# Altium footprint library PowerSupply.PcbLib: 67 footprints (part 2 of 5)
Each footprint in its own frame and in the unit in brackets; x right, y up, seen from the top. Pads: shape width x height; smd on the part's side, far side on the other; paste and mask are expansions set on the pad; w line width, h text height; cw(c..) or ccw(c..) is an arc to the next point about the centre after c.
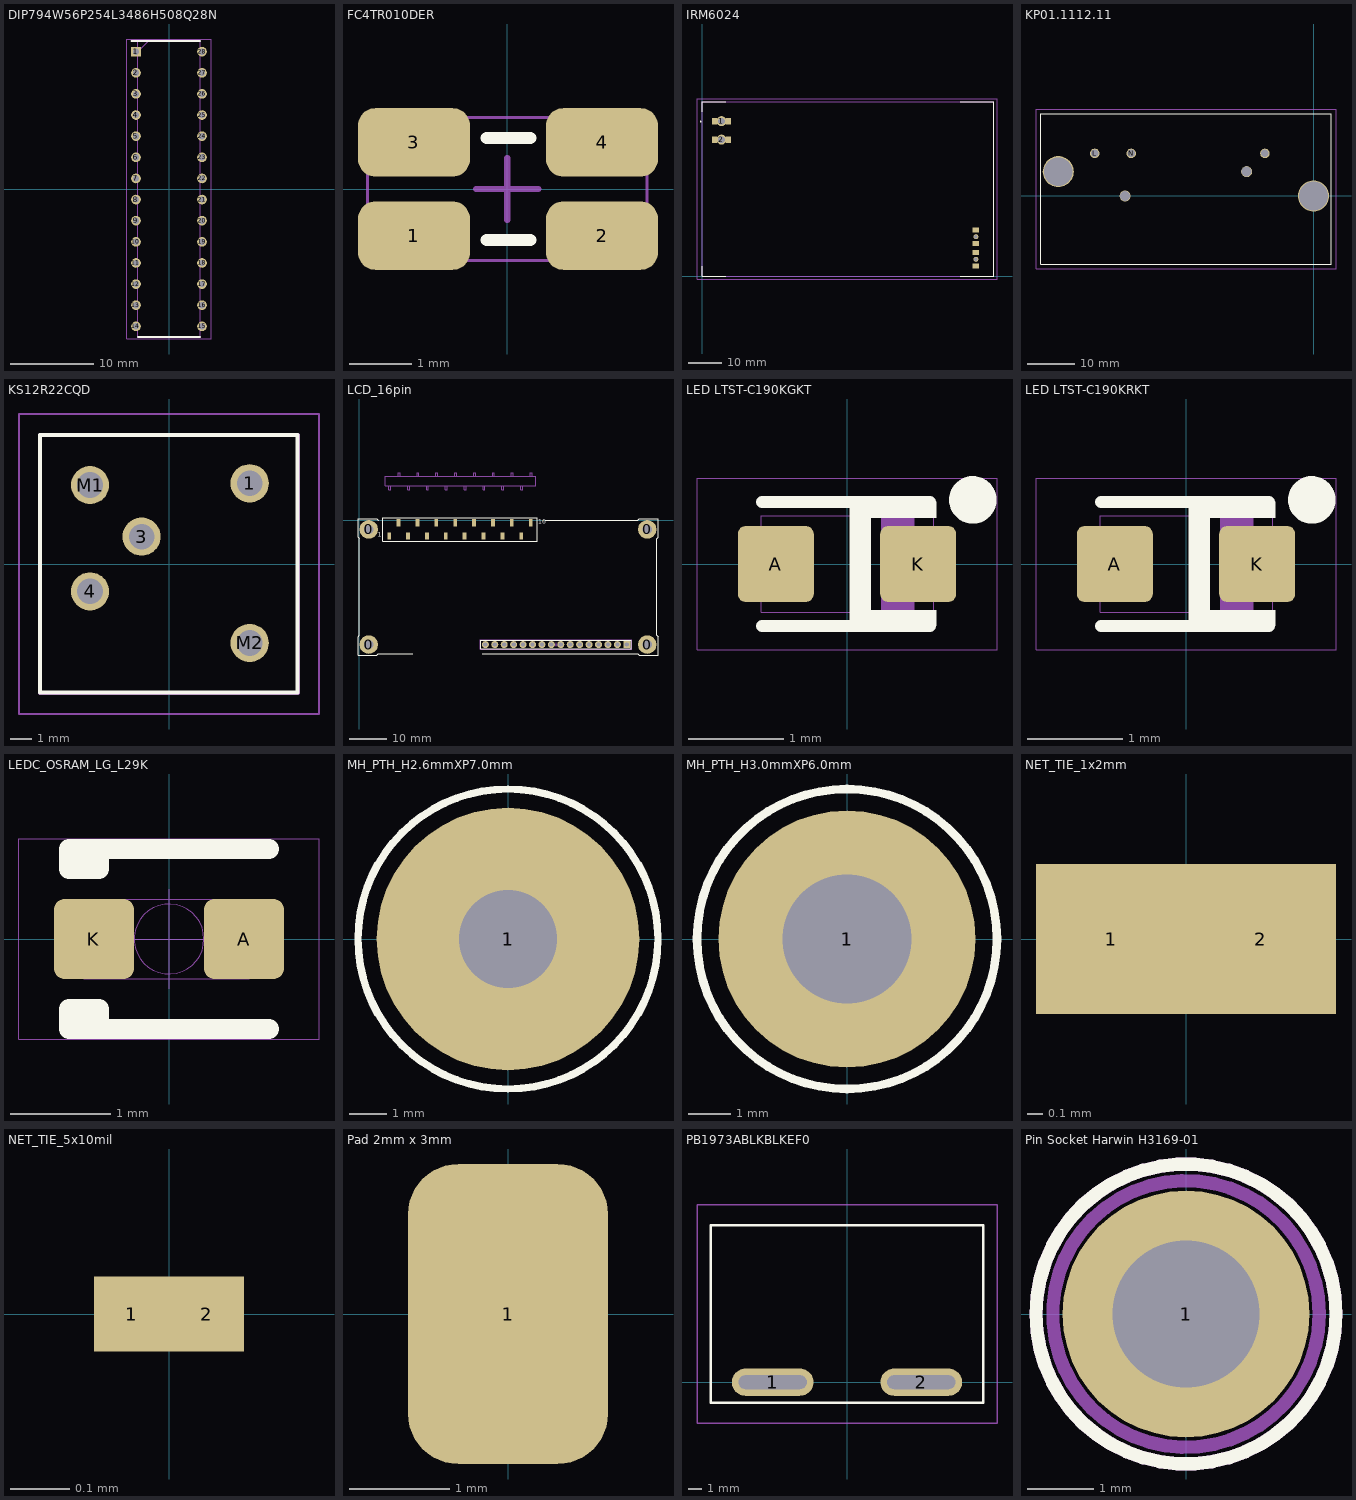
[diagram p1: the footprints below, top view; thin cyan lines are the x and y axes]

## DIP794W56P254L3486H508Q28N [mm]
pads (28):
  rect 1.159x1.159 hole 0.759: 1(-3.969,16.51)
  round 1.159 hole 0.759: 2(-3.969,13.97) 3(-3.969,11.43) 4(-3.969,8.89) 5(-3.969,6.35) 6(-3.969,3.81) 7(-3.969,1.27) 8(-3.969,-1.27) 9(-3.969,-3.81) 10(-3.969,-6.35) 11(-3.969,-8.89) 12(-3.969,-11.43) 13(-3.969,-13.97) 14(-3.969,-16.51) 15(3.969,-16.51) 16(3.969,-13.97) 17(3.969,-11.43) 18(3.969,-8.89) 19(3.969,-6.35) 20(3.969,-3.81) 21(3.969,-1.27) 22(3.969,1.27) 23(3.969,3.81) 24(3.969,6.35) 25(3.969,8.89) 26(3.969,11.43) 27(3.969,13.97) 28(3.969,16.51)
Top Overlay:
  lines w0.2: -4.548,17.78 3.746,17.78 ; -3.746,-17.78 3.746,-17.78
3D Models:
  lines w0.1: -3.746,16.51 -2.476,17.78 ; -3.746,-17.78 -3.746,17.78 3.746,17.78 3.746,-17.78 -3.746,-17.78
Top Courtyard:
  lines w0.05: -5.084,-18.03 -5.084,18.03 5.084,18.03 5.084,-18.03 -5.084,-18.03
3D body "PIC16F876A-I_SP.stp": height 5.08, standoff -3.5, extent -4.108,-17.431 4.108,17.431

## FC4TR010DER [mm] "1206 WIDE"
height 0.65
pads (4):
  rrect50% 1.8x1.1 smd: 1(-1.5,-0.75) 2(1.525,-0.75) 3(-1.5,0.75) 4(1.525,0.75)
Top Overlay:
  lines w0.2: -0.33,-0.82 0.37,-0.82 ; -0.33,0.82 0.37,0.82
Top Courtyard:
  lines w0.05: -2.25,-1.15 -2.25,1.15 2.25,1.15 2.25,-1.15 -2.25,-1.15
  lines w0.1: -0.5,0 0.5,0 ; 0,-0.5 0,0.5
3D body "RESC3116X06N.step": height 0.65, standoff 0, extent -1.65,-0.875 1.65,0.875

## IRM6024 [mm]
pads (12):
  rect 1.5x1.95 smd: 1(3.648,46.25) 1(7.752,46.25) 2(3.648,40.75) 2(7.752,40.75)
  round 3 hole 2: 1(5.7,46.25) 2(5.7,40.75)
  rect 1.95x1.5 smd: 3(81.7,2.948) 3(81.7,7.052) 4(81.7,9.698) 4(81.7,13.802)
  round 1.5 hole 1: 3(81.7,5) 4(81.7,11.75)
Top Overlay:
  lines w0.1: 0,3 0,0 7,0 ; 0,49 0,52 7,52 ; 77,0 87,0 87,52 77,52
  lines w0.2: -0.5,46 ccw(c-0.5,46.1) -0.5,46.2 ccw(c-0.5,46.1) -0.5,46
3D Models:
  lines w0.2: 0,0 87,0 87,52 0,52 0,0
Top Courtyard:
  lines w0.1: -1.6,-1 88,-1 88,53 -1.6,53 -1.6,-1
3D body "s9131-45r.stp": height 4, standoff -0.06, extent 80.551,2.25 82.85,7.75
3D body "s9131-45r.stp": height 4, standoff -0.06, extent 80.551,9 82.85,14.5
3D body "IRM-60-48.stp": height 33, standoff -1, extent 0,0 87,52
3D body "s9111-45r.stp": height 4, standoff -0.06, extent 2.95,45.101 8.45,47.4
3D body "s9111-45r.stp": height 4, standoff -0.06, extent 2.95,39.601 8.45,41.9

## KP01.1112.11 [mm] "PWR ENT MOD RCPT IEC320-C14 PNL"
pads (7):
  round 2 hole 1.6: GND(-10.16,8.9) L(-45.72,8.9) N(-38.1,8.9)
  round 6.5 hole 6 unplated: ""(-53.34,5.08) ""(0,0)
  round 2.3 hole 2.1 unplated: ""(-39.37,0) ""(-13.97,5.08)
Top Overlay:
  lines w0.2: -57,-14.26 3.7,-14.26 3.7,17.176 -57,17.176 -57,-14.26
Top Courtyard:
  lines w0.1: -58,-15.26 -58,18.176 4.7,18.176 4.7,-15.26 -58,-15.26
3D body "e_0100.STEP": height 36.61, standoff -4.35, extent -57.038,-14.176 3.638,17.176

## KS12R22CQD [mm]
pads (5):
  round 1.83 hole 1.22: 1(3.85,3.85) 3(-1.31,1.31) 4(-3.77,-1.31) M1(-3.77,3.77) M2(3.85,-3.77)
Top Overlay:
  lines w0.2: -6.16,-6.14 6.14,-6.14 6.14,6.16 -6.16,6.16 -6.16,-6.14
3D Models:
  lines w0.2: -6.16,-6.16 6.16,-6.16 6.16,6.16 -6.16,6.16 -6.16,-6.16
Top Courtyard:
  lines w0.1: -7.16,-7.16 7.16,-7.16 7.16,7.16 -7.16,7.16 -7.16,-7.16
3D body "KS12R22CQD.stp": height 11, standoff -3, extent -6.16,-6.16 6.16,6.16

## LCD_16pin [mm]
pads (36):
  round 5 hole 2.5: 0(2.5,-33.5) 0(2.5,-2.5) 0(77.5,-33.5) 0(77.5,-2.5)
  rect 1.02x1.905 smd: 1(8,-4.25) 2(10.54,-0.694) 3(13.08,-4.25) 4(15.62,-0.694) 5(18.16,-4.25) 6(20.7,-0.694) 7(23.24,-4.25) 8(25.78,-0.694) 9(28.32,-4.25) 10(30.86,-0.694) 11(33.4,-4.25) 12(35.94,-0.694) 13(38.48,-4.25) 14(41.02,-0.694) 15(43.56,-4.25) 16(46.1,-0.694)
  rect 1.905x1.905 hole 1.143: 1(72,-33.5)
  round 1.905 hole 1.143: 2(69.46,-33.5) 3(66.92,-33.5) 4(64.38,-33.5) 5(61.84,-33.5) 6(59.3,-33.5) 7(56.76,-33.5) 8(54.22,-33.5) 9(51.68,-33.5) 10(49.14,-33.5) 11(46.6,-33.5) 12(44.06,-33.5) 13(41.52,-33.5) 14(38.98,-33.5) 15(36.44,-33.5) 16(33.9,-33.5)
Top Overlay:
  lines w0.16: 32.65,-34.7 73.25,-34.7 73.25,-32.3 32.65,-32.3 32.65,-34.7
  lines w0.2: 5,0 4.6,0.4 -0.4,0.4 -0.4,-4.6 0,-5 0,-31 -0.4,-31.4 -0.4,-36.4 4.6,-36.4 5,-36 14.3,-36 ; 33,-36 75,-36 75.4,-36.4 80.4,-36.4 80.4,-31.4 80,-31 80,-5 80.4,-4.6 80.4,0.4 75.4,0.4 75,0 50.038,0 ; 6.28,-5.654 6.28,0.71 47.82,0.71 47.82,-5.654 6.28,-5.654
  text "1" at 4.91,-4.885 h1.97
  text "16" at 48.161,-1.329 h1.97
Top Paste:
  rectangle: 7.49,-5.202 8.51,-3.297
  rectangle: 10.03,-1.646 11.05,0.259
  rectangle: 12.57,-5.202 13.59,-3.297
  rectangle: 15.11,-1.646 16.13,0.259
  rectangle: 17.65,-5.202 18.67,-3.297
  rectangle: 20.19,-1.646 21.21,0.259
  rectangle: 22.73,-5.202 23.75,-3.297
  rectangle: 25.27,-1.646 26.29,0.259
  rectangle: 27.81,-5.202 28.83,-3.297
  rectangle: 30.35,-1.646 31.37,0.259
  rectangle: 32.89,-5.202 33.91,-3.297
  rectangle: 35.43,-1.646 36.45,0.259
  rectangle: 37.97,-5.202 38.99,-3.297
  rectangle: 40.51,-1.646 41.53,0.259
  rectangle: 43.05,-5.202 44.07,-3.297
  rectangle: 45.59,-1.646 46.61,0.259
Top Solder:
  rectangle: 7.439,-5.254 8.561,-3.246
  rectangle: 9.979,-1.698 11.101,0.31
  rectangle: 12.519,-5.254 13.641,-3.246
  rectangle: 15.059,-1.698 16.181,0.31
  rectangle: 17.599,-5.254 18.721,-3.246
  rectangle: 20.139,-1.698 21.261,0.31
  rectangle: 22.679,-5.254 23.801,-3.246
  rectangle: 25.219,-1.698 26.341,0.31
  rectangle: 27.759,-5.254 28.881,-3.246
  rectangle: 30.299,-1.698 31.421,0.31
  rectangle: 32.839,-5.254 33.961,-3.246
  rectangle: 35.379,-1.698 36.501,0.31
  rectangle: 37.919,-5.254 39.041,-3.246
  rectangle: 40.459,-1.698 41.581,0.31
  rectangle: 42.999,-5.254 44.121,-3.246
  rectangle: 45.539,-1.698 46.661,0.31
Top Assembly RefDes:
  lines w0.1: 32.55,-34.8 32.55,-32.2 73.35,-32.2 73.35,-34.8 32.55,-34.8
Top Courtyard:
  lines w0.1: 52.45,-33.5 53.45,-33.5 ; 52.95,-34 52.95,-33
Bottom Courtyard:
  lines w0.1: 7.896,9.23 7.896,8.214 8.404,8.214 8.404,9.23 ; 11.955,9.23 14.5,9.23 17.04,9.23 ; 11.96,9.23 9.42,9.23 6.88,9.23 6.88,11.77 9.42,11.77 11.965,11.77 ; 11.96,11.77 14.5,11.77 17.045,11.77 ; 17.035,9.23 19.58,9.23 22.12,9.23 ; 17.04,11.77 19.58,11.77 22.125,11.77 ; 22.115,9.23 24.66,9.23 27.2,9.23 ; 22.12,11.77 24.66,11.77 27.205,11.77 ; 27.195,9.23 29.74,9.23 32.28,9.23 ; 27.2,11.77 29.74,11.77 32.285,11.77 ; 32.275,9.23 34.82,9.23 37.36,9.23 ; 32.28,11.77 34.82,11.77 37.365,11.77 ; 37.355,9.23 39.9,9.23 42.44,9.23 ; 37.36,11.77 39.9,11.77 42.445,11.77 ; 42.435,9.23 44.98,9.23 47.52,9.23 47.52,11.77 44.98,11.77 42.44,11.77 ; 45.996,11.77 45.996,12.786 46.504,12.786 46.504,11.77 ; 10.436,11.77 10.69,11.77 10.944,11.77 10.944,12.786 10.436,12.786 10.436,11.77 ; 12.976,8.214 13.484,8.214 13.484,9.23 13.23,9.23 12.976,9.23 12.976,8.214 ; 15.516,11.77 15.77,11.77 16.024,11.77 16.024,12.786 15.516,12.786 15.516,11.77 ; 18.056,8.214 18.564,8.214 18.564,9.23 18.31,9.23 18.056,9.23 18.056,8.214 ; 20.596,11.77 20.85,11.77 21.104,11.77 21.104,12.786 20.596,12.786 20.596,11.77 ; 23.136,8.214 23.644,8.214 23.644,9.23 23.39,9.23 23.136,9.23 23.136,8.214 ; 25.676,11.77 25.93,11.77 26.184,11.77 26.184,12.786 25.676,12.786 25.676,11.77 ; 28.216,8.214 28.724,8.214 28.724,9.23 28.47,9.23 28.216,9.23 28.216,8.214 ; 30.756,11.77 31.01,11.77 31.264,11.77 31.264,12.786 30.756,12.786 30.756,11.77 ; 33.296,8.214 33.804,8.214 33.804,9.23 33.55,9.23 33.296,9.23 33.296,8.214 ; 35.836,11.77 36.09,11.77 36.344,11.77 36.344,12.786 35.836,12.786 35.836,11.77 ; 38.376,8.214 38.884,8.214 38.884,9.23 38.63,9.23 38.376,9.23 38.376,8.214 ; 40.916,11.77 41.17,11.77 41.424,11.77 41.424,12.786 40.916,12.786 40.916,11.77 ; 43.456,8.214 43.964,8.214 43.964,9.23 43.71,9.23 43.456,9.23 43.456,8.214
  text "16" at 48.311,11.643 h1.97
  text "1" at 5.06,8.087 h1.97
3D body "LCD 16X2.STEP": height 18.4, standoff 1.5, extent -0.1,-36.3 79.9,-0.5
3D body "SSM-116-L-SV-BE.stp": height 7.57, standoff 0.07, extent 6.858,-4.854 47.498,-0.282

## LED LTST-C190KGKT [mm]
pads (2):
  rrect20% 0.8x0.8 smd mask+0.064: A(-0.75,0) K(0.75,0)
Top Overlay:
  circle w0.25: c1.325,0.675 r0.125
  rectangle: 0.09,0.483 0.94,0.66
  rectangle: 0.025,-0.651 0.94,-0.483
  rectangle: 0.025,-0.686 0.254,0.686
  lines w0.127: -0.895,-0.651 0.875,-0.651 ; -0.895,0.651 0.875,0.651
Top Assembly Drawing:
  rectangle: 0.357,-0.508 0.711,0.508
  lines w0.013: -0.901,-0.508 -0.901,0.508 0.913,0.508 0.913,-0.508 -0.901,-0.508
Top Assembly RefDes:
  text ".Designator" at -1.803,-0.533 h0.51
Top Courtyard:
  lines w0.013: -1.579,-0.902 1.579,-0.902 1.579,0.902 -1.579,0.902 -1.579,-0.902
3D body: height 0.81, standoff 0, extent -0.347,-0.349 0.35,0.35
3D body: height 0.8, standoff 0, extent -0.907,-0.508 0.907,0.508

## LED LTST-C190KRKT [mm]
pads (2):
  rrect20% 0.8x0.8 smd mask+0.064: A(-0.75,0) K(0.75,0)
Top Overlay:
  circle w0.25: c1.325,0.675 r0.125
  rectangle: 0.025,-0.651 0.94,-0.483
  rectangle: 0.09,0.483 0.94,0.66
  rectangle: 0.025,-0.686 0.254,0.686
  lines w0.127: -0.895,-0.651 0.875,-0.651 ; -0.895,0.651 0.875,0.651
Top Assembly Drawing:
  rectangle: 0.357,-0.508 0.711,0.508
  lines w0.013: -0.901,-0.508 0.913,-0.508 0.913,0.508 -0.901,0.508 -0.901,-0.508
Top Assembly RefDes:
  text ".Designator" at -0.94,-0.203 h0.51
Top Courtyard:
  lines w0.013: -1.579,-0.902 -1.579,0.902 1.579,0.902 1.579,-0.902 -1.579,-0.902
3D body: height 0.8, standoff 0, extent -0.907,-0.508 0.907,0.508
3D body: height 0.81, standoff 0, extent -0.35,-0.35 0.35,0.35

## LEDC_OSRAM_LG_L29K [mm] "LED,Chip;1.70mm L X 0.80mm W X 0.67mm H"
height 0.67
pads (2):
  rrect25% 0.8x0.8 smd paste-10 mask+0.064: A(0.75,0) K(-0.75,0)
Top Overlay:
  lines w0.2: -0.7,-0.9 -0.7,-0.7 -1,-0.7 -1,-0.9 1,-0.9 ; -0.7,0.9 -0.7,0.7 -1,0.7 -1,0.9 1,0.9
Top Paste:
  region: 1.05,-0.35 0.5,-0.35 0.5,0.35 1.05,0.35 1.06,0.35 1.078,0.342 1.092,0.328 1.1,0.31 1.1,0.3 1.1,-0.3 1.1,-0.31 1.092,-0.328 1.078,-0.342 1.06,-0.35
  region: -1.05,0.35 -0.5,0.35 -0.5,-0.35 -1.05,-0.35 -1.06,-0.35 -1.078,-0.342 -1.092,-0.328 -1.1,-0.31 -1.1,-0.3 -1.1,0.3 -1.1,0.31 -1.092,0.328 -1.078,0.342 -1.06,0.35
Top Assembly Drawing:
  region: -0.85,0.4 -0.5,0.4 -0.5,-0.4 -0.85,-0.4
  lines w0.01: -0.85,-0.4 0.8,-0.4 0.8,0.4 -0.85,0.4 -0.85,-0.4
Top Assembly RefDes:
  text ".Designator" at -0.8,-0.2 h1
Top Courtyard:
  circle w0.01: c0,0 r0.35
  lines w0.01: -0.5,0 0.5,0 ; 0,-0.5 0,0.5 ; -1.5,-1 -1.5,1 1.5,1 1.5,-1 -1.5,-1
3D body: height 0.65, standoff 0.13, extent -0.65,-0.4 0.65,0.4
3D body: height 0.13, standoff 0, extent -0.85,-0.4 0.85,0.4

## MH_PTH_H2.6mmXP7.0mm [mm] "Plated Through Hole, 2.6mm hole x 7.0mm pad"
pads (1):
  round 7 hole 2.6 mask+0.064: 1(0,0)
Top Overlay:
  circle w0.2: c0,0 r4
Bottom Overlay:
  circle w0.254: c0,0 r4
Top Assembly RefDes:
  text ".Designator" at -2.6,-1.3 h3
Top Courtyard:
  circle w0.01: c0,0 r4

## MH_PTH_H3.0mmXP6.0mm [mm] "Plated Through Hole, 3.0mm hole x 6.0mm pad"
pads (1):
  round 6 hole 3 mask+0.064: 1(0,0)
Top Overlay:
  circle w0.2: c0,0 r3.5
Bottom Overlay:
  circle w0.254: c0,0 r3.5
Top Assembly RefDes:
  text ".Designator" at -1.3,-0.9 h3
Top Courtyard:
  circle w0.01: c0,0 r3.5

## NET_TIE_1x2mm [mm] "Net Tie 2 1x1mm Pads"
pads (2):
  rect 1x1 smd: 1(-0.5,0) 2(0.5,0)

## NET_TIE_5x10mil [mil] "Net Tie 2 5x5mil Pads"
pads (2):
  rect 5x5 smd: 1(-2.5,0) 2(2.5,0)

## Pad 2mm x 3mm [mm]
height 1.1
pads (1):
  rrect50% 2x3 smd paste-1.27: 1(0,0)

## PB1973ABLKBLKEF0 [mm] "SWITCH PUSH SPST 15A 250V"
pads (2):
  oval 6x2 hole 1 slot 5 at 0 deg: 1(-5.45,0) 2(5.45,0)
Top Overlay:
  lines w0.2: -10,-1.5 10,-1.5 10,11.5 -10,11.5 -10,-1.5
Top Courtyard:
  lines w0.1: -11,-3 11,-3 11,13 -11,13 -11,-3
3D body "PB1973AxxxxxxEF0.stp": height 24.4, standoff -8.2, extent -10.5,-2.5 10.5,12.5

## Pin Socket Harwin H3169-01 [mm] "Pin Socket Harwin H3169-01"
pads (1):
  round 3.7 hole 2.2: 1(0,0)
Top Overlay:
  circle w0.2: c0,0 r2.25
Top Assembly Drawing:
  circle w0.2: c0,0 r2
Top Assembly RefDes:
  text "'.Designator'" at -0.375,-0.325 h0.5
Top Courtyard:
  circle w0.2: c0,0 r2.25
3D body "h3169-01_asm.stp": height 0.96, standoff -5.04, extent -1.59,-1.59 1.59,1.592